# Altium footprint library TG102LE4G_A7682_240822.PcbLib: 38 footprints (part 3 of 3)
Each footprint in its own frame and in the unit in brackets; x right, y up, seen from the top. Pads: shape width x height; smd on the part's side, far side on the other; paste and mask are expansions set on the pad; w line width, h text height; cw(c..) or ccw(c..) is an arc to the next point about the centre after c.
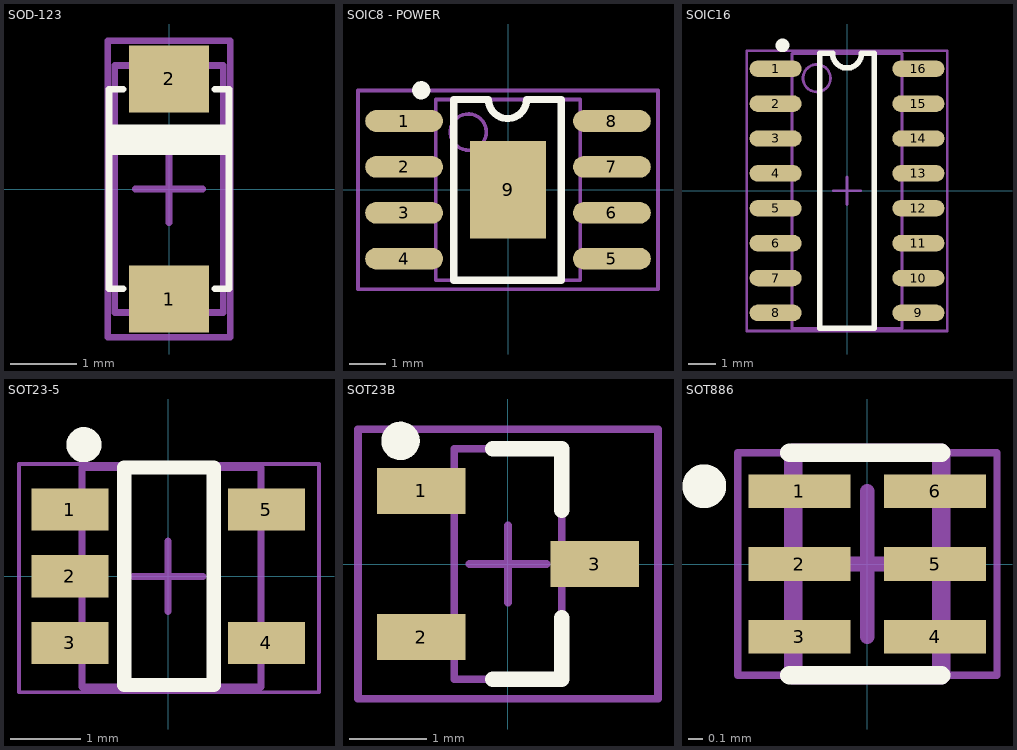
[diagram p2: the footprints below, top view; thin cyan lines are the x and y axes]

## SOD-123 [mm] "SOD123, 2-Leads, Body 2.6x1.6mm, Pitch 3.05mm, IPC High Density"
height 0.85
pads (2):
  rect 1.2x1 smd: 1(0,-1.652) 2(0,1.652)
Top Overlay:
  rectangle: -0.889,0.508 0.864,0.965
  lines w0.1: -0.687,-1.5 -0.9,-1.5 -0.9,1.5 -0.687,1.5 ; 0.687,-1.5 0.9,-1.5 0.9,1.5 0.687,1.5
Mechanical 13:
  lines w0.1: -0.813,-1.854 0.813,-1.854 0.813,1.854 -0.813,1.854 -0.813,-1.854
Mechanical 15:
  lines w0.1: -0.508,0 0.508,0 ; 0,-0.508 0,0.508 ; 0.914,2.228 -0.92,2.228 -0.92,-2.228 0.92,-2.228 0.92,2.228
3D body "SOD123.STEP": height 1.27, standoff 0, extent -0.8,-1.85 0.8,1.85

## SOIC8 - POWER [mm] "SOIC, 8-Leads, Body 4.9x3.9mm, Pitch 1.27mm, IPC Medium Density"
height 1.75
pads (9):
  oval 2.15x0.6 smd: 1(-2.875,1.905) 2(-2.875,0.635) 3(-2.875,-0.635) 4(-2.875,-1.905) 5(2.875,-1.905) 6(2.875,-0.635) 7(2.875,0.635) 8(2.875,1.905)
  rect 2.1x2.7 smd: 9(0,0)
Top Overlay:
  circle w0.25: c-2.4,2.755 r0.125
  lines w0.2: -1.5,-2.5 -1.5,2.5 -0.54,2.5 ccw(c-0.012,2.5) 0.515,2.5 1.475,2.5 1.475,-2.5 -1.5,-2.5
Mechanical 13:
  circle w0.1: c-1.1,1.6 r0.5
  lines w0.1: -2,-2.5 -2,2.5 2,2.5 2,-2.5 -2,-2.5
Mechanical 15:
  lines w0.1: -0.5,0 0.5,0 ; 0,-0.5 0,0.5 ; -4.15,-2.75 -4.15,2.75 4.15,2.75 4.15,-2.75 -4.15,-2.75
3D body "User Library-SOIC-8-1.STEP": height 1.75, standoff 0, extent -3,-2.45 3,2.45

## SOIC16 [mm] "SOIC, 16-Leads, Body 9.9x3.9mm, Pitch 1.27mm, IPC High Density"
height 1.91
pads (16):
  oval 1.9x0.6 smd: 1(-2.6,4.445) 2(-2.6,3.175) 3(-2.6,1.905) 4(-2.6,0.635) 5(-2.6,-0.635) 6(-2.6,-1.905) 7(-2.6,-3.175) 8(-2.6,-4.445) 9(2.6,-4.445) 10(2.6,-3.175) 11(2.6,-1.905) 12(2.6,-0.635) 13(2.6,0.635) 14(2.6,1.905) 15(2.6,3.175) 16(2.6,4.445)
Top Overlay:
  circle w0.25: c-2.35,5.295 r0.125
  lines w0.2: -1,-5 1,-5 1,5 0.527,5 cw(c0,5) -0.527,5 -1,5 -1,-5
Mechanical 13:
  circle w0.1: c-1.1,4.1 r0.5
  lines w0.1: -2,-5 2,-5 2,5 -2,5 -2,-5
Mechanical 15:
  lines w0.1: -0.5,0 0.5,0 ; 0,-0.5 0,0.5 ; -3.65,-5.1 3.65,-5.1 3.65,5.1 -3.65,5.1 -3.65,-5.1
3D body "User Library-SOIC-16-2.STEP": height 1.75, standoff 0, extent -3.025,-5 2.975,5

## SOT23-5 [mm] "SOT23, 5-Leads, Body 2.10x2.30mm, Pitch 0.65mm, IPC Medium Density"
height 1
pads (5):
  rect 1.1x0.6 smd paste-0.05: 1(-1.4,0.95) 2(-1.4,0) 3(-1.4,-0.95) 4(1.4,-0.95) 5(1.4,0.95)
Top Overlay:
  circle w0.25: c-1.2,1.875 r0.125
  lines w0.2: -0.625,-1.55 0.65,-1.55 0.65,1.55 -0.625,1.55 -0.625,-1.55
Mechanical 13:
  lines w0.1: -1.225,-1.575 -1.225,1.55 1.325,1.55 1.325,-1.575 -1.225,-1.575
Mechanical 15:
  lines w0.05: -2.125,-1.65 -2.125,1.6 2.15,1.6 2.15,-1.65 -2.125,-1.65
  lines w0.1: -0.5,0 0.5,0 ; 0,-0.5 0,0.5
3D body "SOT23-5 pitch 0.95 .STEP": height 1.45, standoff 0.01, extent -1.524,-1.561 1.676,1.539

## SOT23B [mm] "SOT23, 3-Leads, Body 2.9x1.3mm, Pitch 0.95mm, Lead Span 2.4mm, IPC High Density"
height 1.14
pads (3):
  rect 1.15x0.6 smd: 1(-1.125,0.95) 2(-1.125,-0.95) 3(1.125,0)
Top Overlay:
  circle w0.25: c-1.397,1.6 r0.125
  lines w0.2: -0.2,-1.5 0.7,-1.5 0.7,-0.7 ; -0.2,1.5 0.7,1.5 0.7,0.7
Mechanical 13:
  lines w0.1: -0.7,-1.5 0.7,-1.5 0.7,1.5 -0.7,1.5 -0.7,-1.5
Mechanical 15:
  lines w0.1: -0.5,0 0.5,0 ; 0,-0.5 0,0.5 ; -1.95,-1.75 1.95,-1.75 1.95,1.75 -1.95,1.75 -1.95,-1.75
3D body "SOT23-3.STEP": height 1.05, standoff -0.04, extent -1.25,-1.5 1.25,1.5

## SOT886 [mm] "6-Leads, Body 1.5x1.0mm, Pitch 0.5mm, IPC High Density"
height 0.5
pads (6):
  rect 0.7x0.23 smd mask+0.05: 1(-0.465,0.5) 2(-0.465,0) 3(-0.465,-0.5) 4(0.465,-0.5) 5(0.465,0) 6(0.465,0.5)
Top Overlay:
  circle w0.2: c-1.118,0.533 r0.05
  lines w0.127: -0.533,-0.762 0.508,-0.762 ; -0.533,0.762 0.508,0.762
Mechanical 13:
  lines w0.127: -0.508,-0.762 -0.508,0.762 0.508,0.762 0.508,-0.762 -0.508,-0.762
Mechanical 15:
  lines w0.05: -0.889,-0.762 -0.889,0.762 0.889,0.762 0.889,-0.762 -0.889,-0.762
  lines w0.1: -0.5,0 0.5,0 ; 0,-0.5 0,0.5
3D body "User Library-SOT886 (XSON6).step": height 0.49, standoff -0.01, extent -0.533,-0.763 0.517,0.737